# Altium footprint library PCBLIB.PcbLib: 557 footprints (part 34 of 36)
Each footprint in its own frame and in the unit in brackets; x right, y up, seen from the top. Pads: shape width x height; smd on the part's side, far side on the other; paste and mask are expansions set on the pad; w line width, h text height; cw(c..) or ccw(c..) is an arc to the next point about the centre after c.
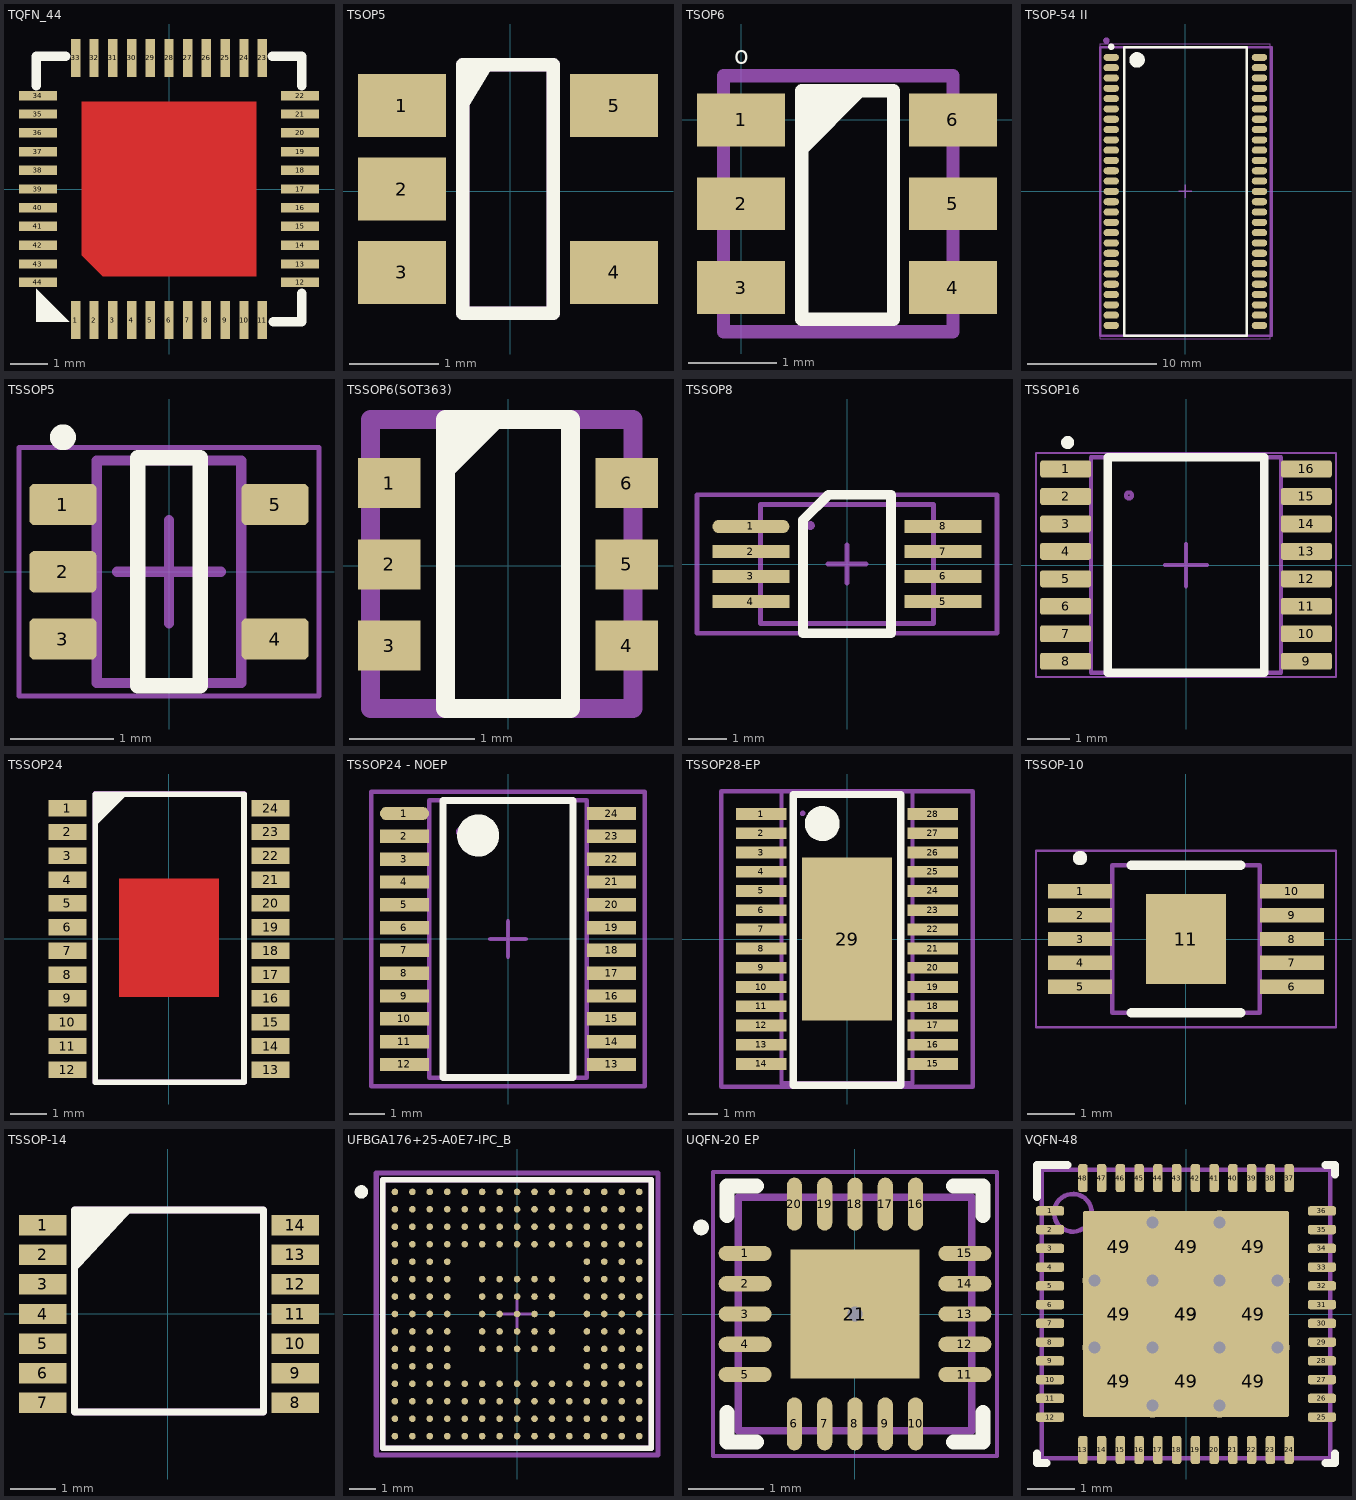
[diagram p33: the footprints below, top view; thin cyan lines are the x and y axes]

## TQFN_44 [mil]
pads (44):
  rect 10x40 smd mask+0: 1(-98,-138) 2(-79,-138) 3(-59,-138) 4(-39,-138) 5(-20,-138) 6(0,-138) 7(20,-138) 8(39,-138) 9(59,-138) 10(79,-138) 11(98,-138) 23(98,138) 24(79,138) 25(59,138) 26(39,138) 27(20,138) 28(0,138) 29(-20,138) 30(-39,138) 31(-59,138) 32(-79,138) 33(-98,138)
  rect 40x10 smd mask+0: 12(138,-98) 13(138,-79) 14(138,-59) 15(138,-39) 16(138,-20) 17(138,0) 18(138,20) 19(138,39) 20(138,59) 21(138,79) 22(138,98) 34(-138,98) 35(-138,79) 36(-138,59) 37(-138,39) 38(-138,20) 39(-138,0) 40(-138,-20) 41(-138,-39) 42(-138,-59) 43(-138,-79) 44(-138,-98)
Top Layer:
  region: 92,92 -92,92 -92,-70 -70,-92 92,-92
Top Overlay:
  region: -140,-105 -140,-140 -105,-140
  lines w10: -140,109 -140,140 -109,140 ; 109,140 140,140 140,109 ; 110,-140 140,-140 140,-110

## TSOP5 [mil]
pads (5):
  rect 39x28 smd mask+2: 1(-47.95,38) 2(-47.95,1) 3(-47.95,-36) 4(46.05,-36) 5(46.05,38)
Top Overlay:
  region: -7.37,56 -20.95,56 -20.95,33.36
  lines w6: -20.95,-54 19.05,-54 19.05,56 -20.95,56 -20.95,-54
ASM Top:
  lines w6: -20.95,-54 -20.95,56 19.05,56 19.05,-54 -20.95,-54
  text ".designator" at -27.56,-11.81 h31.5
3D body "5-TSOP.STEP": height 43.31, standoff 0, extent -59.06,-61.03 59.05,61.02

## TSOP6 [mm]
pads (6):
  rect 1x0.6 smd: 1(0,0) 2(0,-0.95) 3(0,-1.9) 4(2.4,-1.9) 5(2.4,-0.95) 6(2.4,0)
Top Overlay:
  region: 0.686,0.33 0.686,-0.432 1.448,0.33
  lines w0.152: 0.686,-2.261 1.727,-2.261 1.727,0.33 0.686,0.33 0.686,-2.261
  text "o" at -0.076,0.635 h0.2
ASM Top:
  lines w0.15: -0.2,-2.4 2.4,-2.4 2.4,0.5 -0.2,0.5 -0.2,-2.4
  text ".designator" at 0.8,-0.8 h1.5
3D body "TSOP6.STEP": height 1.01, standoff -0.04, extent -0.232,-2.465 2.518,0.535

## TSOP-54 II [mm] "TSOP, 54-Leads, Body 22.22x10.16mm, Pitch 0.80mm, IPC Medium Density"
height 1.2
pads (54):
  oval 1.2x0.55 smd mask+0.05: 1(-5.75,10.4) 2(-5.75,9.6) 3(-5.75,8.8) 4(-5.75,8) 5(-5.75,7.2) 6(-5.75,6.4) 7(-5.75,5.6) 8(-5.75,4.8) 9(-5.75,4) 10(-5.75,3.2) 11(-5.75,2.4) 12(-5.75,1.6) 13(-5.75,0.8) 14(-5.75,0) 15(-5.75,-0.8) 16(-5.75,-1.6) 17(-5.75,-2.4) 18(-5.75,-3.2) 19(-5.75,-4) 20(-5.75,-4.8) 21(-5.75,-5.6) 22(-5.75,-6.4) 23(-5.75,-7.2) 24(-5.75,-8) 25(-5.75,-8.8) 26(-5.75,-9.6) 27(-5.75,-10.4) 28(5.75,-10.4) 29(5.75,-9.6) 30(5.75,-8.8) 31(5.75,-8) 32(5.75,-7.2) 33(5.75,-6.4) 34(5.75,-5.6) 35(5.75,-4.8) 36(5.75,-4) 37(5.75,-3.2) 38(5.75,-2.4) 39(5.75,-1.6) 40(5.75,-0.8) 41(5.75,0) 42(5.75,0.8) 43(5.75,1.6) 44(5.75,2.4) 45(5.75,3.2) 46(5.75,4) 47(5.75,4.8) 48(5.75,5.6) 49(5.75,6.4) 50(5.75,7.2) 51(5.75,8) 52(5.75,8.8) 53(5.75,9.6) 54(5.75,10.4)
Top Overlay:
  circle w0.6: c-3.75,10.2 r0.3
  circle w0.25: c-5.75,11.225 r0.125
  lines w0.2: -4.75,-11.2 4.75,-11.2 4.75,11.2 -4.75,11.2 -4.75,-11.2
Mechanical 15:
  lines w0.05: -6.6,-11.45 6.6,-11.45 6.6,11.45 -6.6,11.45 -6.6,-11.45
  lines w0.1: -0.5,0 0.5,0 ; 0,-0.5 0,0.5
ASM Top:
  circle w0.25: c-6.125,11.7 r0.125
  circle w0.2: c-3.75,10.2 r0.112
  lines w0.2: -6.6,-11.2 -6.6,11.2 6.7,11.2 6.7,-11.2 -6.6,-11.2
  text ".designator" at 0,0 h0.8
3D body "User Library-TSOP-54-1.step": height 1.25, standoff 0, extent -5.88,-11.11 5.88,11.11

## TSSOP5 [mm] "SOT23, 5-Leads, Body 2.15x1.4mm, Pitch 0.65mm, IPC High Density"
height 1.1
pads (5):
  rrect25% 0.65x0.4 smd mask+0.051: 1(-1.025,0.65) 2(-1.025,0) 3(-1.025,-0.65) 4(1.025,-0.65) 5(1.025,0.65)
Top Overlay:
  circle w0.15: c-1.025,1.3 r0.05
  lines w0.15: -0.3,-1.1 -0.3,1.1 0.3,1.1 0.3,-1.1 -0.3,-1.1
Mechanical 15:
  lines w0.05: -1.45,-1.2 1.45,-1.2 1.45,1.2 -1.45,1.2 -1.45,-1.2
  lines w0.1: -0.5,0 0.5,0 ; 0,-0.5 0,0.5
ASM Top:
  lines w0.1: -0.7,-1.075 -0.7,1.075 0.7,1.075 0.7,-1.075 -0.7,-1.075
  text ".designator" at -0.4,-0.1 h0.8
3D body "DCK0005AakaMAA05A.stp": height 0.94, standoff -0.01, extent -1.14,-1 1.14,1

## TSSOP6(SOT363) [mm]
pads (6):
  rect 0.5x0.4 smd mask+0.05: 1(-0.95,0.659) 2(-0.95,0.009) 3(-0.95,-0.641) 4(0.95,-0.641) 5(0.95,0.009) 6(0.95,0.659)
Top Overlay:
  region: -0.465,1.168 -0.465,0.7 0.003,1.168
  lines w0.152: -0.5,-1.143 -0.5,1.168 0.5,1.168 0.5,-1.143 -0.5,-1.143
ASM Top:
  lines w0.15: -1.1,-1.143 1,-1.143 1,1.168 -1.1,1.168 -1.1,-1.143
  text ".designator" at -0.051,-0.457 h0.8
3D body "TSSOP6.STEP": height 1.11, standoff 0.01, extent -1.1,-0.991 1.1,1.009

## TSSOP8 [mm]
height 1.2
pads (8):
  oval 2x0.35 smd: 1(-2.5,0.975)
  rect 2x0.35 smd: 2(-2.5,0.325) 3(-2.5,-0.325) 4(-2.5,-0.975) 5(2.5,-0.975) 6(2.5,-0.325) 7(2.5,0.325) 8(2.5,0.975)
Top Overlay:
  lines w0.254: -1.143,-1.8 1.143,-1.8 1.143,1.8 -0.486,1.8 -1.143,1.143 -1.143,-1.8
Mechanical 15:
  lines w0.127: -0.5,0 0.5,0 ; 0,-0.5 0,0.5 ; -3.9,-1.8 -3.9,1.8 3.9,1.8 3.9,-1.8 -3.9,-1.8
ASM Top:
  circle w0.127: c-0.95,1 r0.05
  lines w0.127: -1.55,-1.55 1.55,-1.55 ; -1.55,1.55 1.55,1.55 ; -2.25,-1.55 2.25,-1.55 2.25,1.55 -2.25,1.55 -2.25,-1.55
  text ".designator" at -0.5,-0.2 h0.8
3D body "TSSOP8.step": height 1.2, standoff 0, extent -3.2,-1.55 3.2,1.55

## TSSOP16 [mm]
pads (16):
  rrect25% 1.2x0.4 smd mask+0.05: 1(-2.85,2.275) 2(-2.85,1.625) 3(-2.85,0.975) 4(-2.85,0.325) 5(-2.85,-0.325) 6(-2.85,-0.975) 7(-2.85,-1.625) 8(-2.85,-2.275) 9(2.85,-2.275) 10(2.85,-1.625) 11(2.85,-0.975) 12(2.85,-0.325) 13(2.85,0.325) 14(2.85,0.975) 15(2.85,1.625) 16(2.85,2.275)
Top Overlay:
  lines w0.2: -1.85,-2.55 -1.85,2.55 1.85,2.55 1.85,-2.55 -1.85,-2.55
  lines w0.254: -2.783,2.921 ccw(c-2.8,2.9) -2.773,2.901
Mechanical 15:
  lines w0.05: -3.55,-2.65 -3.55,2.65 3.55,2.65 3.55,-2.65 -3.55,-2.65
  lines w0.1: -0.5,0 0.5,0 ; 0,-0.5 0,0.5
ASM Top:
  circle w0.1: c-1.35,1.65 r0.071
  lines w0.1: -2.25,-2.55 2.25,-2.55 2.25,2.55 -2.25,2.55 -2.25,-2.55
  text ".designator" at -0.496,0 h0.8
3D body "TSSOP-16-2.STEP": height 1.21, standoff 0.01, extent -3.205,-2.5 3.195,2.5
3D body "PW0016AakaMTC16.stp": height 1, standoff 0, extent -3.21,-2.5 3.21,2.5

## TSSOP24 [mm]
pads (24):
  rect 1.05x0.45 smd mask+0.051: 1(-2.775,3.575) 2(-2.775,2.925) 3(-2.775,2.275) 4(-2.775,1.625) 5(-2.775,0.975) 6(-2.775,0.325) 7(-2.775,-0.325) 8(-2.775,-0.975) 9(-2.775,-1.625) 10(-2.775,-2.275) 11(-2.775,-2.925) 12(-2.775,-3.575) 13(2.775,-3.575) 14(2.775,-2.925) 15(2.775,-2.275) 16(2.775,-1.625) 17(2.775,-0.975) 18(2.775,-0.325) 19(2.775,0.325) 20(2.775,0.975) 21(2.775,1.625) 22(2.775,2.275) 23(2.775,2.925) 24(2.775,3.575)
Top Layer:
  region: 1.359,1.651 1.359,-1.575 -1.359,-1.575 -1.359,1.651
Top Overlay:
  region: -1.14,3.96 -2.013,3.956 -2.013,3.087
  lines w0.152: -2.013,-3.918 -2.013,3.956 2.051,3.956 2.051,-3.918 -2.013,-3.918
ASM Top:
  lines w0.152: -2.013,-3.912 2.051,-3.912 2.051,3.962 -2.013,3.962 -2.013,-3.912
  text ".designator" at -0.1,1.4 h0.8
3D body "TSSOP-24.STEP": height 1.21, standoff 0.01, extent -3.175,-3.912 3.225,3.888

## TSSOP24 - NOEP [mm]
height 1.1
pads (24):
  oval 1.397x0.381 smd: 1(-2.95,3.575)
  rect 1.397x0.381 smd: 2(-2.95,2.925) 3(-2.95,2.275) 4(-2.95,1.625) 5(-2.95,0.975) 6(-2.95,0.325) 7(-2.95,-0.325) 8(-2.95,-0.975) 9(-2.95,-1.625) 10(-2.95,-2.275) 11(-2.95,-2.925) 12(-2.95,-3.575) 13(2.95,-3.575) 14(2.95,-2.925) 15(2.95,-2.275) 16(2.95,-1.625) 17(2.95,-0.975) 18(2.95,-0.325) 19(2.95,0.325) 20(2.95,0.975) 21(2.95,1.625) 22(2.95,2.275) 23(2.95,2.925) 24(2.95,3.575)
Top Overlay:
  circle w0.6: c-0.85,2.95 r0.3
  lines w0.2: -1.85,-3.95 1.85,-3.95 1.85,3.95 -1.85,3.95 -1.85,-3.95
Mechanical 15:
  lines w0.127: -0.5,0 0.5,0 ; 0,-0.5 0,0.5 ; -3.9,-4.2 3.9,-4.2 3.9,4.2 -3.9,4.2 -3.9,-4.2
ASM Top:
  circle w0.127: c-1.35,3.05 r0.071
  lines w0.127: -2.25,-3.95 -2.25,3.95 2.25,3.95 2.25,-3.95 -2.25,-3.95
  text ".designator" at -0.8,-0.3 h0.8
3D body "TSSOP24.step": height 1.1, standoff 0, extent -3.2,-3.95 3.2,3.95

## TSSOP28-EP [mil]
height 47.24
pads (29):
  rect 68x16 smd mask+1.97: 1(-116,169) 2(-116,143) 3(-116,117) 4(-116,91) 5(-116,65) 6(-116,39) 7(-116,13) 8(-116,-13) 9(-116,-39) 10(-116,-65) 11(-116,-91) 12(-116,-117) 13(-116,-143) 14(-116,-169) 15(116,-169) 16(116,-143) 17(116,-117) 18(116,-91) 19(116,-65) 20(116,-39) 21(116,-13) 22(116,13) 23(116,39) 24(116,65) 25(116,91) 26(116,117) 27(116,143) 28(116,169)
  rect 122x220 smd paste-109.5 mask+1.97: 29(0,0)
Top Overlay:
  circle w23.62: c-33.46,156.14 r11.81
  lines w10: -72.83,-198 72.83,-198 72.83,195.51 -72.83,195.51 -72.83,-198
Top Paste:
  region: -3.94,106.06 -57.06,106.06 -57.06,58.94 -3.94,58.94
  region: -3.94,51.06 -57.06,51.06 -57.06,3.94 -3.94,3.94
  region: -3.94,-3.94 -57.06,-3.94 -57.06,-51.06 -3.94,-51.06
  region: -3.94,-58.94 -57.06,-58.94 -57.06,-106.06 -3.94,-106.06
  region: 57.06,106.06 3.94,106.06 3.94,58.94 57.06,58.94
  region: 57.06,51.06 3.94,51.06 3.94,3.94 57.06,3.94
  region: 57.06,-3.94 3.94,-3.94 3.94,-51.06 57.06,-51.06
  region: 57.06,-58.94 3.94,-58.94 3.94,-106.06 57.06,-106.06
Mechanical 15:
  lines w6: -170,-200 -170,200 -108.5,200 108.5,200 170,200 170,-200 108.5,-200 -108.5,-200 -170,-200
ASM Top:
  circle w5: c-59.99,170 r1.17
  lines w5: -88.58,-195 -88.58,200 88.58,200 88.58,-195 -88.58,-195
  text ".designator" at -30.5,-3.94 h31.5
3D body "TSSOP28-EP.step": height 47.24, standoff 0, extent -130.32,-192.91 130.32,192.92

## TSSOP-10 [mm] "TSSOP, 10-Leads, Body 3,00x3,00mm, Pitch 0,50mm, Thermal Pad 1,89x1,69mm, IPC Medium Density"
height 1.1
pads (11):
  rect 1.35x0.3 smd mask+0.051: 1(-2.225,1) 2(-2.225,0.5) 3(-2.225,0) 4(-2.225,-0.5) 5(-2.225,-1) 6(2.225,-1) 7(2.225,-0.5) 8(2.225,0) 9(2.225,0.5) 10(2.225,1)
  rect 1.69x1.89 smd mask+0.051: 11(0,0)
Top Overlay:
  circle w0.25: c-2.225,1.7 r0.025
  lines w0.2: -1.15,-1.55 1.15,-1.55 ; -1.15,1.55 1.15,1.55
Mechanical 15:
  lines w0.05: -3.15,-1.85 -3.15,1.85 3.15,1.85 3.15,-1.85 -3.15,-1.85
  lines w0.1: -0.5,0 0.5,0 ; 0,-0.5 0,0.5
ASM Top:
  circle w0.1: c-0.65,0.65 r0.025
  lines w0.1: -1.55,-1.55 -1.55,1.55 1.55,1.55 1.55,-1.55 -1.55,-1.55
  text ".designator" at -0.25,-0.1 h1.2
3D body "User Library-AD5170BRMZ100-ND.STEP": height 0.97, standoff -0.03, extent -2.463,-1.5 2.464,1.5

## TSSOP-14 [mm]
pads (14):
  rect 1.05x0.45 smd mask+0.051: 1(-2.749,1.939) 2(-2.749,1.289) 3(-2.749,0.639) 4(-2.749,-0.011) 5(-2.749,-0.661) 6(-2.749,-1.311) 7(-2.749,-1.961) 8(2.801,-1.961) 9(2.801,-1.311) 10(2.801,-0.661) 11(2.801,-0.011) 12(2.801,0.639) 13(2.801,1.289) 14(2.801,1.939)
Top Overlay:
  region: -0.786,2.275 -2.057,2.275 -2.057,0.901
  lines w0.152: -2.057,-2.17 -2.057,2.275 2.109,2.275 2.109,-2.17 -2.057,-2.17
ASM Top:
  lines w0.152: -2.057,-2.17 2.109,-2.17 2.109,2.275 -2.057,2.275 -2.057,-2.17
  text ".designator" at -0.2,-0.1 h0.8
3D body "TSSOP-14.STEP": height 1.21, standoff 0.01, extent -3.2,-2.5 3.2,2.5

## UFBGA176+25-A0E7-IPC_B [mm]
pads (201):
  round 0.246 smd paste+0 mask+0.05: A1(-4.55,4.55) A2(-3.9,4.55) A3(-3.25,4.55) A4(-2.6,4.55) A5(-1.95,4.55) A6(-1.3,4.55) A7(-0.65,4.55) A8(0,4.55) A9(0.65,4.55) A10(1.3,4.55) A11(1.95,4.55) A12(2.6,4.55) A13(3.25,4.55) A14(3.9,4.55) A15(4.55,4.55) B1(-4.55,3.9) B2(-3.9,3.9) B3(-3.25,3.9) B4(-2.6,3.9) B5(-1.95,3.9) B6(-1.3,3.9) B7(-0.65,3.9) B8(0,3.9) B9(0.65,3.9) B10(1.3,3.9) B11(1.95,3.9) B12(2.6,3.9) B13(3.25,3.9) B14(3.9,3.9) B15(4.55,3.9) C1(-4.55,3.25) C2(-3.9,3.25) C3(-3.25,3.25) C4(-2.6,3.25) C5(-1.95,3.25) C6(-1.3,3.25) C7(-0.65,3.25) C8(0,3.25) C9(0.65,3.25) C10(1.3,3.25) C11(1.95,3.25) C12(2.6,3.25) C13(3.25,3.25) C14(3.9,3.25) C15(4.55,3.25) D1(-4.55,2.6) D2(-3.9,2.6) D3(-3.25,2.6) D4(-2.6,2.6) D5(-1.95,2.6) D6(-1.3,2.6) D7(-0.65,2.6) D8(0,2.6) D9(0.65,2.6) D10(1.3,2.6) D11(1.95,2.6) D12(2.6,2.6) D13(3.25,2.6) D14(3.9,2.6) D15(4.55,2.6) E1(-4.55,1.95) E2(-3.9,1.95) E3(-3.25,1.95) E4(-2.6,1.95) E12(2.6,1.95) E13(3.25,1.95) E14(3.9,1.95) E15(4.55,1.95) F1(-4.55,1.3) F2(-3.9,1.3) F3(-3.25,1.3) F4(-2.6,1.3) F6(-1.3,1.3) F7(-0.65,1.3) F8(0,1.3) F9(0.65,1.3) F10(1.3,1.3) F12(2.6,1.3) F13(3.25,1.3) F14(3.9,1.3) F15(4.55,1.3) G1(-4.55,0.65) G2(-3.9,0.65) G3(-3.25,0.65) G4(-2.6,0.65) G6(-1.3,0.65) G7(-0.65,0.65) G8(0,0.65) G9(0.65,0.65) G10(1.3,0.65) G12(2.6,0.65) G13(3.25,0.65) G14(3.9,0.65) G15(4.55,0.65) H1(-4.55,0) H2(-3.9,0) H3(-3.25,0) H4(-2.6,0) H6(-1.3,0) H7(-0.65,0) H8(0,0) H9(0.65,0) H10(1.3,0) H12(2.6,0) H13(3.25,0) H14(3.9,0) H15(4.55,0) J1(-4.55,-0.65) J2(-3.9,-0.65) J3(-3.25,-0.65) J4(-2.6,-0.65) J6(-1.3,-0.65) J7(-0.65,-0.65) J8(0,-0.65) J9(0.65,-0.65) J10(1.3,-0.65) J12(2.6,-0.65) J13(3.25,-0.65) J14(3.9,-0.65) J15(4.55,-0.65) K1(-4.55,-1.3) K2(-3.9,-1.3) K3(-3.25,-1.3) K4(-2.6,-1.3) K6(-1.3,-1.3) K7(-0.65,-1.3) K8(0,-1.3) K9(0.65,-1.3) K10(1.3,-1.3) K12(2.6,-1.3) K13(3.25,-1.3) K14(3.9,-1.3) K15(4.55,-1.3) L1(-4.55,-1.95) L2(-3.9,-1.95) L3(-3.25,-1.95) L4(-2.6,-1.95) L12(2.6,-1.95) L13(3.25,-1.95) L14(3.9,-1.95) L15(4.55,-1.95) M1(-4.55,-2.6) M2(-3.9,-2.6) M3(-3.25,-2.6) M4(-2.6,-2.6) M5(-1.95,-2.6) M6(-1.3,-2.6) M7(-0.65,-2.6) M8(0,-2.6) M9(0.65,-2.6) M10(1.3,-2.6) M11(1.95,-2.6) M12(2.6,-2.6) M13(3.25,-2.6) M14(3.9,-2.6) M15(4.55,-2.6) N1(-4.55,-3.25) N2(-3.9,-3.25) N3(-3.25,-3.25) N4(-2.6,-3.25) N5(-1.95,-3.25) N6(-1.3,-3.25) N7(-0.65,-3.25) N8(0,-3.25) N9(0.65,-3.25) N10(1.3,-3.25) N11(1.95,-3.25) N12(2.6,-3.25) N13(3.25,-3.25) N14(3.9,-3.25) N15(4.55,-3.25) P1(-4.55,-3.9) P2(-3.9,-3.9) P3(-3.25,-3.9) P4(-2.6,-3.9) P5(-1.95,-3.9) P6(-1.3,-3.9) P7(-0.65,-3.9) P8(0,-3.9) P9(0.65,-3.9) P10(1.3,-3.9) P11(1.95,-3.9) P12(2.6,-3.9) P13(3.25,-3.9) P14(3.9,-3.9) P15(4.55,-3.9) R1(-4.55,-4.55) R2(-3.9,-4.55) R3(-3.25,-4.55) R4(-2.6,-4.55) R5(-1.95,-4.55) R6(-1.3,-4.55) R7(-0.65,-4.55) R8(0,-4.55) R9(0.65,-4.55) R10(1.3,-4.55) R11(1.95,-4.55) R12(2.6,-4.55) R13(3.25,-4.55) R14(3.9,-4.55) R15(4.55,-4.55)
Top Overlay:
  circle w0.25: c-5.8,4.55 r0.125
  lines w0.2: -5,-5 5,-5 5,5 -5,5 -5,-5
Mechanical 13:
  lines w0.2: -5,-5 5,-5 5,5 -5,5 -5,-5
Mechanical 15:
  lines w0.2: -5.25,-5.25 5.25,-5.25 5.25,5.25 -5.25,5.25 -5.25,-5.25
Mechanical 16:
  lines w0.1: -0.5,0 0.5,0 ; 0,-0.5 0,0.5
ASM Top:
  lines w0.15: -5,-5 -5,5 5,5 5,-5 -5,-5
  text ".designator" at 0,0 h0.8
3D body "IC_STMicroelectronics_STM32H743IIK6_eec.STEP": height 0.6, standoff 0, extent -5,-5 5,5

## UQFN-20 EP [mm] "QFN, 20-Leads, Body 3x3mm, , Thermal Pad 1.7x1.7mm, IPC High Density"
height 0.6
pads (21):
  oval 0.7x0.2 smd mask+0.05: 1(-1.45,0.8) 2(-1.45,0.4) 3(-1.45,0) 4(-1.45,-0.4) 5(-1.45,-0.8) 11(1.45,-0.8) 12(1.45,-0.4) 13(1.45,0) 14(1.45,0.4) 15(1.45,0.8)
  oval 0.2x0.7 smd mask+0.05: 6(-0.8,-1.45) 7(-0.4,-1.45) 8(0,-1.45) 9(0.4,-1.45) 10(0.8,-1.45) 16(0.8,1.45) 17(0.4,1.45) 18(0,1.45) 19(-0.4,1.45) 20(-0.8,1.45)
  rect 1.7x1.7 smd mask+0.05: 21(0,0)
via 0,0 diameter 0.5 hole 0.2
Top Overlay:
  circle w0.1: c-2.032,1.143 r0.054
  lines w0.2: -1.69,-1.3 -1.69,-1.69 -1.3,-1.69 ; -1.69,1.3 -1.69,1.69 -1.3,1.69 ; 1.3,-1.69 1.69,-1.69 1.69,-1.3 ; 1.3,1.69 1.69,1.69 1.69,1.3
Mechanical 15:
  lines w0.05: -1.875,-1.875 1.875,-1.875 1.875,1.875 -1.875,1.875 -1.875,-1.875
  lines w0.1: -0.5,0 0.5,0 ; 0,-0.5 0,0.5
ASM Top:
  lines w0.1: -1.54,-1.54 1.54,-1.54 1.54,1.54 -1.54,1.54 -1.54,-1.54
  text ".designator" at -0.5,-0.3 h1.2
3D body: height 0.6, standoff 0, extent -1.54,-1.54 1.54,1.54

## VQFN-48 [mm]
pads (58):
  rrect50% 0.6x0.2 smd: 1(-2.9,2.2) 2(-2.9,1.8) 3(-2.9,1.4) 4(-2.9,1) 5(-2.9,0.6) 6(-2.9,0.2) 7(-2.9,-0.2) 8(-2.9,-0.6) 9(-2.9,-1) 10(-2.9,-1.4) 11(-2.9,-1.8) 12(-2.9,-2.2) 25(2.9,-2.2) 26(2.9,-1.8) 27(2.9,-1.4) 28(2.9,-1) 29(2.9,-0.6) 30(2.9,-0.2) 31(2.9,0.2) 32(2.9,0.6) 33(2.9,1) 34(2.9,1.4) 35(2.9,1.8) 36(2.9,2.2)
  rrect50% 0.2x0.6 smd: 13(-2.2,-2.9) 14(-1.8,-2.9) 15(-1.4,-2.9) 16(-1,-2.9) 17(-0.6,-2.9) 18(-0.2,-2.9) 19(0.2,-2.9) 20(0.6,-2.9) 21(1,-2.9) 22(1.4,-2.9) 23(1.8,-2.9) 24(2.2,-2.9) 37(2.2,2.9) 38(1.8,2.9) 39(1.4,2.9) 40(1,2.9) 41(0.6,2.9) 42(0.2,2.9) 43(-0.2,2.9) 44(-0.6,2.9) 45(-1,2.9) 46(-1.4,2.9) 47(-1.8,2.9) 48(-2.2,2.9)
  rrect50% 1.23x1.23 on Top Paste: 49(-1.43,-1.43) 49(-1.43,0) 49(-1.43,1.43) 49(0,-1.43) 49(0,0) 49(0,1.43) 49(1.43,-1.43) 49(1.43,0) 49(1.43,1.43)
  rrect2% 4.4x4.4 smd paste-2.2: 49(0,0)
via 0.715,0.715 diameter 0.508 hole 0.254
via 1.95,0.715 diameter 0.508 hole 0.254
via 0.715,1.95 diameter 0.508 hole 0.254
via -0.715,1.95 diameter 0.508 hole 0.254
via -0.715,-1.95 diameter 0.508 hole 0.254
via 0.715,-1.95 diameter 0.508 hole 0.254
via -1.95,0.715 diameter 0.508 hole 0.254
via -0.715,0.715 diameter 0.508 hole 0.254
via -0.715,-0.715 diameter 0.508 hole 0.254
via -1.95,-0.715 diameter 0.508 hole 0.254
via 1.95,-0.715 diameter 0.508 hole 0.254
via 0.715,-0.715 diameter 0.508 hole 0.254
Top Overlay:
  lines w0.17: -3.175,-2.975 -3.175,-3.175 -2.975,-3.175 ; -3.175,2.5 -3.175,3.175 -2.525,3.175 ; 2.975,-3.175 3.175,-3.175 3.175,-2.975 ; 2.975,3.175 3.175,3.175 3.175,2.975
ASM Top:
  circle w0.1: c-2.413,2.159 r0.402
  lines w0.1: -3.075,-3.075 -3.075,3.075 3.075,3.075 3.075,-3.075 -3.075,-3.075 ; -3.075,-2.33 -3.075,-2.07 -3.075,-2.33 ; -3.075,-1.93 -3.075,-1.67 -3.075,-1.93 ; -3.075,-1.53 -3.075,-1.27 -3.075,-1.53 ; -3.075,-1.13 -3.075,-0.87 -3.075,-1.13 ; -3.075,-0.73 -3.075,-0.47 -3.075,-0.73 ; -3.075,-0.33 -3.075,-0.07 -3.075,-0.33 ; -3.075,0.07 -3.075,0.33 -3.075,0.07 ; -3.075,0.47 -3.075,0.73 -3.075,0.47 ; -3.075,0.87 -3.075,1.13 -3.075,0.87 ; -3.075,1.27 -3.075,1.53 -3.075,1.27 ; -3.075,1.67 -3.075,1.93 -3.075,1.67 ; -3.075,2.07 -3.075,2.33 -3.075,2.07 ; -2.33,-3.075 -2.07,-3.075 -2.33,-3.075 ; -2.33,3.075 -2.07,3.075 -2.33,3.075 ; -1.93,-3.075 -1.67,-3.075 -1.93,-3.075 ; -1.93,3.075 -1.67,3.075 -1.93,3.075 ; -1.53,-3.075 -1.27,-3.075 -1.53,-3.075 ; -1.53,3.075 -1.27,3.075 -1.53,3.075 ; -1.13,-3.075 -0.87,-3.075 -1.13,-3.075 ; -1.13,3.075 -0.87,3.075 -1.13,3.075 ; -0.73,-3.075 -0.47,-3.075 -0.73,-3.075 ; -0.73,3.075 -0.47,3.075 -0.73,3.075 ; -0.33,-3.075 -0.07,-3.075 -0.33,-3.075 ; -0.33,3.075 -0.07,3.075 -0.33,3.075 ; 0.07,-3.075 0.33,-3.075 0.07,-3.075 ; 0.07,3.075 0.33,3.075 0.07,3.075 ; 0.47,-3.075 0.73,-3.075 0.47,-3.075 ; 0.47,3.075 0.73,3.075 0.47,3.075 ; 0.87,-3.075 1.13,-3.075 0.87,-3.075 ; 0.87,3.075 1.13,3.075 0.87,3.075 ; 1.27,-3.075 1.53,-3.075 1.27,-3.075 ; 1.27,3.075 1.53,3.075 1.27,3.075 ; 1.67,-3.075 1.93,-3.075 1.67,-3.075 ; 1.67,3.075 1.93,3.075 1.67,3.075 ; 2.07,-3.075 2.33,-3.075 2.07,-3.075 ; 2.07,3.075 2.33,3.075 2.07,3.075 ; 3.075,-2.33 3.075,-2.07 3.075,-2.33 ; 3.075,-1.93 3.075,-1.67 3.075,-1.93 ; 3.075,-1.53 3.075,-1.27 3.075,-1.53 ; 3.075,-1.13 3.075,-0.87 3.075,-1.13 ; 3.075,-0.73 3.075,-0.47 3.075,-0.73 ; 3.075,-0.33 3.075,-0.07 3.075,-0.33 ; 3.075,0.07 3.075,0.33 3.075,0.07 ; 3.075,0.47 3.075,0.73 3.075,0.47 ; 3.075,0.87 3.075,1.13 3.075,0.87 ; 3.075,1.27 3.075,1.53 3.075,1.27 ; 3.075,1.67 3.075,1.93 3.075,1.67 ; 3.075,2.07 3.075,2.33 3.075,2.07
  text ".Designator" at -1.6,-0.3 h1.02
3D body: height 1.01, standoff 0, extent -2.814,1.758 -2.012,2.56
3D body: height 1, standoff 0, extent -3.074,-3.074 3.074,3.074